# Altium footprint library Face_InMain1V0.PcbLib: 83 footprints (part 6 of 6)
Each footprint in its own frame and in the unit in brackets; x right, y up, seen from the top. Pads: shape width x height; smd on the part's side, far side on the other; paste and mask are expansions set on the pad; w line width, h text height; cw(c..) or ccw(c..) is an arc to the next point about the centre after c.
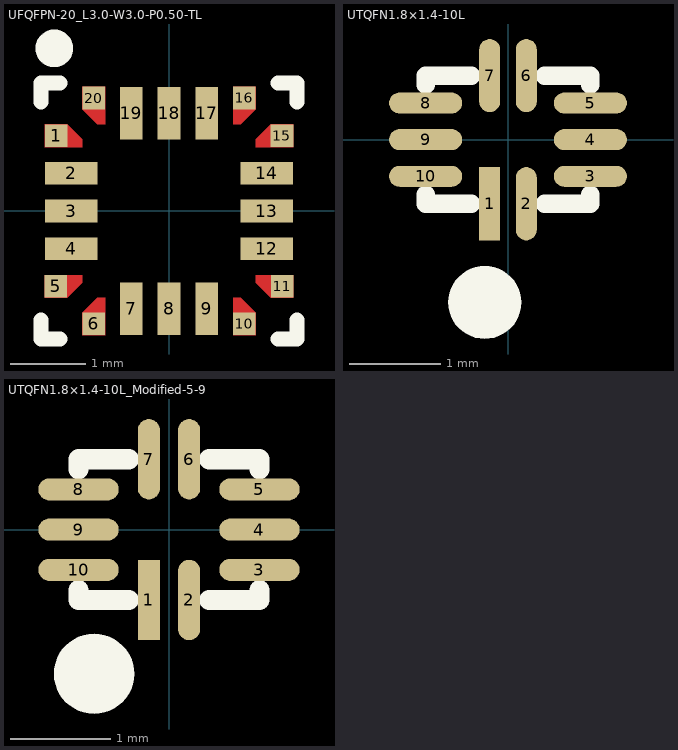
[diagram p5: the footprints below, top view; thin cyan lines are the x and y axes]

## UFQFPN-20_L3.0-W3.0-P0.50-TL [mm]
pads (20):
  rect 0.3x0.3 smd mask+0.076: 1(-1.499,1.001) 5(-1.502,-1.001) 6(-1.001,-1.5) 10(1,-1.501) 11(1.502,-1) 15(1.501,1) 16(0.999,1.501) 20(-1,1.5)
  rect 0.7x0.3 smd mask+0.076: 2(-1.3,0.499) 3(-1.3,0) 4(-1.3,-0.501) 12(1.3,-0.501) 13(1.3,0) 14(1.3,0.499)
  rect 0.3x0.7 smd mask+0.076: 7(-0.5,-1.3) 8(0,-1.3) 9(0.5,-1.3) 17(0.5,1.3) 18(0,1.3) 19(-0.5,1.3)
Top Layer:
  region: -1.15,1.649 -0.85,1.649 -0.85,1.149 -0.95,1.149 -1.15,1.349
  region: 0.85,1.649 0.85,1.149 0.95,1.149 1.15,1.349 1.15,1.649
  region: 1.15,-0.851 1.15,-0.951 1.35,-1.151 1.65,-1.151 1.65,-0.851
  region: 1.65,1.149 1.65,0.849 1.15,0.849 1.15,0.949 1.35,1.149
  region: -1.65,-1.151 -1.65,-0.851 -1.15,-0.851 -1.15,-0.951 -1.35,-1.151
  region: -1.15,-1.651 -0.85,-1.651 -0.85,-1.151 -0.95,-1.151 -1.15,-1.351
  region: 1.15,-1.651 0.85,-1.651 0.85,-1.151 0.95,-1.151 1.15,-1.351
  region: -1.65,1.149 -1.65,0.849 -1.15,0.849 -1.15,0.949 -1.35,1.149
Top Overlay:
  lines w0.2: -1.7,-1.45 -1.7,-1.7 -1.45,-1.7 ; -1.7,1.45 -1.7,1.7 -1.45,1.7 ; 1.45,-1.7 1.7,-1.7 1.7,-1.45 ; 1.45,1.7 1.7,1.7 1.7,1.45
  lines w0.25: -1.399,2.158 cw(c-1.524,2.159) -1.399,2.16
Top Paste:
  region: -1.15,1.649 -0.85,1.649 -0.85,1.149 -0.95,1.149 -1.15,1.349
  region: 0.85,1.649 0.85,1.149 0.95,1.149 1.15,1.349 1.15,1.649
  region: 1.15,-0.851 1.15,-0.951 1.35,-1.151 1.65,-1.151 1.65,-0.851
  region: -1.65,1.149 -1.65,0.849 -1.15,0.849 -1.15,0.949 -1.35,1.149
  region: 1.65,1.149 1.65,0.849 1.15,0.849 1.15,0.949 1.35,1.149
  region: -1.65,-1.151 -1.65,-0.851 -1.15,-0.851 -1.15,-0.951 -1.35,-1.151
  region: -1.15,-1.651 -0.85,-1.651 -0.85,-1.151 -0.95,-1.151 -1.15,-1.351
  region: 1.15,-1.651 0.85,-1.651 0.85,-1.151 0.95,-1.151 1.15,-1.351
  region: -1.15,0.85 -1.35,0.85 -1.35,1.15 -1.15,0.95
Top Solder:
  region: -1.15,1.649 -0.85,1.649 -0.85,1.149 -0.95,1.149 -1.15,1.349
  region: 0.85,1.649 0.85,1.149 0.95,1.149 1.15,1.349 1.15,1.649
  region: 1.15,-0.851 1.15,-0.951 1.35,-1.151 1.65,-1.151 1.65,-0.851
  region: -1.65,1.149 -1.65,0.849 -1.15,0.849 -1.15,0.949 -1.35,1.149
  region: 1.65,1.149 1.65,0.849 1.15,0.849 1.15,0.949 1.35,1.149
  region: -1.65,-1.151 -1.65,-0.851 -1.15,-0.851 -1.15,-0.951 -1.35,-1.151
  region: -1.15,-1.651 -0.85,-1.651 -0.85,-1.151 -0.95,-1.151 -1.15,-1.351
  region: 1.15,-1.651 0.85,-1.651 0.85,-1.151 0.95,-1.151 1.15,-1.351

## UTQFN1.8×1.4-10L [mm]
pads (11):
  rect 0.23x0.8 smd mask+0.03: 1(-0.2,-0.7)
  oval 0.23x0.8 smd mask+0.03: 2(0.2,-0.7) 6(0.2,0.7) 7(-0.2,0.7)
  oval 0.8x0.23 smd mask+0.03: 3(0.9,-0.4) 4(0.9,0) 5(0.9,0.4) 8(-0.9,0.4) 9(-0.9,0) 10(-0.9,-0.4)
  round 0.8 on Top Overlay mask+0.102: ""(-0.254,-1.778)
Top Overlay:
  lines w0.2: -0.9,-0.6 -0.9,-0.7 -0.4,-0.7 ; -0.9,0.6 -0.9,0.7 -0.4,0.7 ; 0.4,-0.7 0.9,-0.7 0.9,-0.6 ; 0.4,0.7 0.9,0.7 0.9,0.6
3D body: height 1, standoff 0, extent -0.9,-0.7 0.9,0.7

## UTQFN1.8×1.4-10L_Modified-5-9 [mm]
pads (11):
  rect 0.22x0.8 smd mask+0.05: 1(-0.2,-0.7)
  oval 0.22x0.8 smd mask+0.05: 2(0.2,-0.7) 6(0.2,0.7) 7(-0.2,0.7)
  oval 0.8x0.22 smd mask+0.05: 3(0.9,-0.4) 4(0.9,0) 5(0.9,0.4) 8(-0.9,0.4) 9(-0.9,0) 10(-0.9,-0.4)
  round 0.8 on Top Overlay mask+0.102: ""(-0.745,-1.434)
Top Overlay:
  lines w0.2: -0.9,-0.6 -0.9,-0.7 -0.4,-0.7 ; -0.9,0.6 -0.9,0.7 -0.4,0.7 ; 0.4,-0.7 0.9,-0.7 0.9,-0.6 ; 0.4,0.7 0.9,0.7 0.9,0.6
Top Solder:
  rectangle: 0.45,-0.41 1.35,0.39
  rectangle: -0.2,0.25 0.21,1.15
  rectangle: -0.2,-1.15 0.2,-0.25
  rectangle: -1.35,-0.41 -0.45,0.4
3D body: height 1, standoff 0, extent -0.9,-0.7 0.9,0.7